# Altium schematic symbol library jlcpcb_2025_04_ferrites_extended_0603.schlib: 833 symbols (part 2 of 4)
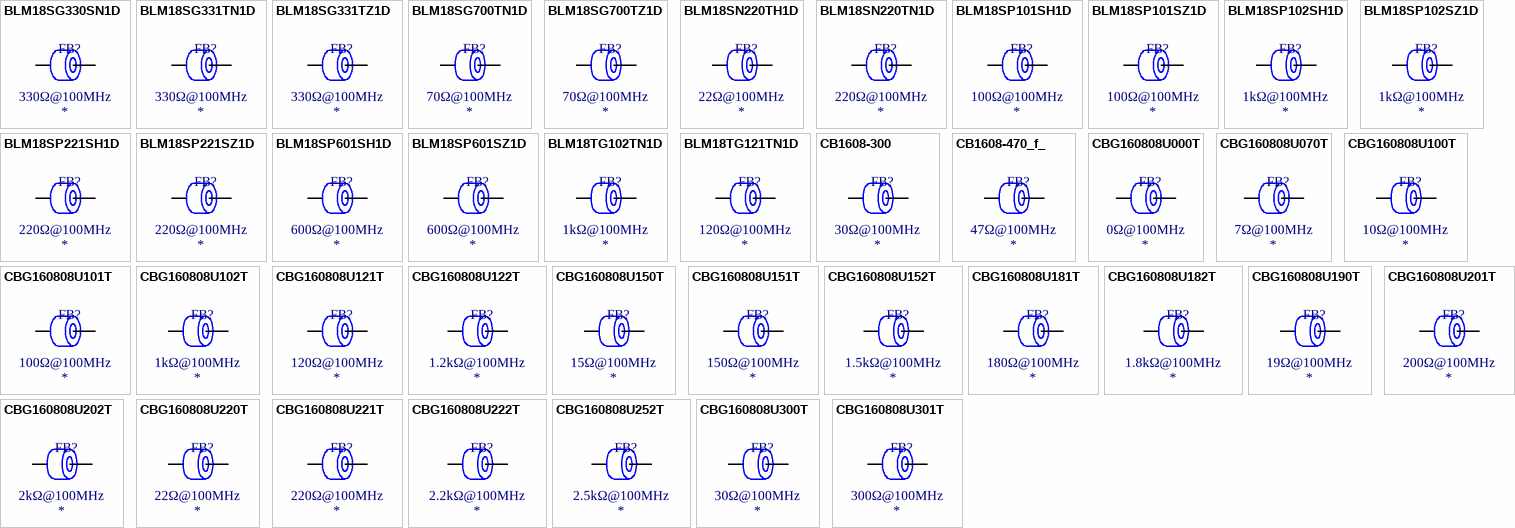
[diagram p21: symbols BLM18SG330SN1D to CBG160808U301T]

## BLM18SN220TH1D
designator FB?  Impedance @ Frequency: 22Ω@100MHz
Ferrite, 22Ω@100MHz, ±7%, 4mΩ, 8A, SMD 0603; Manufacturer: Murata Electronics; Manufacturer Part Number: BLM18SN220TH1D; Package Size: 0603; JLCPCB Basic Part: No; JLCPCB Part Number: C710392; Supplier 1: LCSC; Category: Ferrite Beads; Supplier Part Number 1: C710392; Tolerance: ±7%; Rated Current: 8A; DC Resistance: 4mΩ; RoHS: Yes; ComponentLink1Description: Datasheet; ComponentLink1URL: https://wmsc.lcsc.com/wmsc/upload/file/pdf/v2/lcsc/2304140030_Murata-Electronics-BLM18SN220TH1D_C710392.pdf; ComponentLink2Description: JLCPCB Part URL; ComponentLink2URL: https://jlcpcb.com/partdetail/C710392; ComponentLink3Description: LCSC Part URL; ComponentLink3URL: https://lcsc.com/product-detail/Ferrite-Beads_Murata-Electronics-Murata-Electronics-BLM18SN220TH1D_C710392.html
footprint FB-0603 (0603 (1608M) Ferrite)
pins: 1, 2

## BLM18SN220TN1D
designator FB?  Impedance @ Frequency: 220Ω@100MHz
Ferrite, 220Ω@100MHz, ±7%, 4mΩ, 8A, SMD 0603; Manufacturer: Murata Electronics; Manufacturer Part Number: BLM18SN220TN1D; Package Size: 0603; JLCPCB Basic Part: No; JLCPCB Part Number: C560057; Supplier 1: LCSC; Category: Ferrite Beads; Supplier Part Number 1: C560057; Tolerance: ±7%; Rated Current: 8A; DC Resistance: 4mΩ; RoHS: Yes; ComponentLink1Description: Datasheet; ComponentLink1URL: https://wmsc.lcsc.com/wmsc/upload/file/pdf/v2/lcsc/2009151403_Murata-Electronics-BLM18SN220TN1D_C560057.pdf; ComponentLink2Description: JLCPCB Part URL; ComponentLink2URL: https://jlcpcb.com/partdetail/C560057; ComponentLink3Description: LCSC Part URL; ComponentLink3URL: https://lcsc.com/product-detail/Ferrite-Beads_Murata-Electronics-Murata-Electronics-BLM18SN220TN1D_C560057.html
footprint FB-0603 (0603 (1608M) Ferrite)
pins: 1, 2

## BLM18SP101SH1D
designator FB?  Impedance @ Frequency: 100Ω@100MHz
Ferrite, 100Ω@100MHz, ±25%, 22mΩ, 3.7A, SMD 0603; Manufacturer: Murata Electronics; Manufacturer Part Number: BLM18SP101SH1D; Package Size: 0603; JLCPCB Basic Part: No; JLCPCB Part Number: C1512135; Supplier 1: LCSC; Category: Ferrite Beads; Supplier Part Number 1: C1512135; Tolerance: ±25%; Rated Current: 3.7A; DC Resistance: 22mΩ; RoHS: Yes; ComponentLink1Description: Datasheet; ComponentLink1URL: https://wmsc.lcsc.com/wmsc/upload/file/pdf/v2/lcsc/2304140030_Murata-Electronics-BLM18SP101SH1D_C1512135.pdf; ComponentLink2Description: JLCPCB Part URL; ComponentLink2URL: https://jlcpcb.com/partdetail/C1512135; ComponentLink3Description: LCSC Part URL; ComponentLink3URL: https://lcsc.com/product-detail/Ferrite-Beads_Murata-Electronics-Murata-Electronics-BLM18SP101SH1D_C1512135.html
footprint FB-0603 (0603 (1608M) Ferrite)
pins: 1, 2

## BLM18SP101SZ1D
designator FB?  Impedance @ Frequency: 100Ω@100MHz
Ferrite, 100Ω@100MHz, ±25%, 22mΩ, 3.7A, SMD 0603; Manufacturer: Murata Electronics; Manufacturer Part Number: BLM18SP101SZ1D; Package Size: 0603; JLCPCB Basic Part: No; JLCPCB Part Number: C1512136; Supplier 1: LCSC; Category: Ferrite Beads; Supplier Part Number 1: C1512136; Tolerance: ±25%; Rated Current: 3.7A; DC Resistance: 22mΩ; RoHS: Yes; ComponentLink1Description: Datasheet; ComponentLink1URL: https://wmsc.lcsc.com/wmsc/upload/file/pdf/v2/lcsc/2304140030_Murata-Electronics-BLM18SP101SZ1D_C1512136.pdf; ComponentLink2Description: JLCPCB Part URL; ComponentLink2URL: https://jlcpcb.com/partdetail/C1512136; ComponentLink3Description: LCSC Part URL; ComponentLink3URL: https://lcsc.com/product-detail/Ferrite-Beads_Murata-Electronics-Murata-Electronics-BLM18SP101SZ1D_C1512136.html
footprint FB-0603 (0603 (1608M) Ferrite)
pins: 1, 2

## BLM18SP102SH1D
designator FB?  Impedance @ Frequency: 1kΩ@100MHz
Ferrite, 1kΩ@100MHz, ±25%, 185mΩ, 1.2A, SMD 0603; Manufacturer: Murata Electronics; Manufacturer Part Number: BLM18SP102SH1D; Package Size: 0603; JLCPCB Basic Part: No; JLCPCB Part Number: C1512132; Supplier 1: LCSC; Category: Ferrite Beads; Supplier Part Number 1: C1512132; Tolerance: ±25%; Rated Current: 1.2A; DC Resistance: 185mΩ; RoHS: Yes; ComponentLink1Description: Datasheet; ComponentLink1URL: https://wmsc.lcsc.com/wmsc/upload/file/pdf/v2/lcsc/2304140030_Murata-Electronics-BLM18SP102SH1D_C1512132.pdf; ComponentLink2Description: JLCPCB Part URL; ComponentLink2URL: https://jlcpcb.com/partdetail/C1512132; ComponentLink3Description: LCSC Part URL; ComponentLink3URL: https://lcsc.com/product-detail/Ferrite-Beads_Murata-Electronics-Murata-Electronics-BLM18SP102SH1D_C1512132.html
footprint FB-0603 (0603 (1608M) Ferrite)
pins: 1, 2

## BLM18SP102SZ1D
designator FB?  Impedance @ Frequency: 1kΩ@100MHz
Ferrite, 1kΩ@100MHz, ±25%, 185mΩ, 1.2A, SMD 0603; Manufacturer: Murata Electronics; Manufacturer Part Number: BLM18SP102SZ1D; Package Size: 0603; JLCPCB Basic Part: No; JLCPCB Part Number: C1019083; Supplier 1: LCSC; Category: Ferrite Beads; Supplier Part Number 1: C1019083; Tolerance: ±25%; Rated Current: 1.2A; DC Resistance: 185mΩ; RoHS: Yes; ComponentLink1Description: Datasheet; ComponentLink1URL: https://wmsc.lcsc.com/wmsc/upload/file/pdf/v2/lcsc/2304140030_Murata-Electronics-BLM18SP102SZ1D_C1019083.pdf; ComponentLink2Description: JLCPCB Part URL; ComponentLink2URL: https://jlcpcb.com/partdetail/C1019083; ComponentLink3Description: LCSC Part URL; ComponentLink3URL: https://lcsc.com/product-detail/Ferrite-Beads_Murata-Electronics-Murata-Electronics-BLM18SP102SZ1D_C1019083.html
footprint FB-0603 (0603 (1608M) Ferrite)
pins: 1, 2

## BLM18SP221SH1D
designator FB?  Impedance @ Frequency: 220Ω@100MHz
Ferrite, 220Ω@100MHz, ±25%, 40mΩ, 2.8A, SMD 0603; Manufacturer: Murata Electronics; Manufacturer Part Number: BLM18SP221SH1D; Package Size: 0603; JLCPCB Basic Part: No; JLCPCB Part Number: C1512134; Supplier 1: LCSC; Category: Ferrite Beads; Supplier Part Number 1: C1512134; Tolerance: ±25%; Rated Current: 2.8A; DC Resistance: 40mΩ; RoHS: Yes; ComponentLink1Description: Datasheet; ComponentLink1URL: https://wmsc.lcsc.com/wmsc/upload/file/pdf/v2/lcsc/2304140030_Murata-Electronics-BLM18SP221SH1D_C1512134.pdf; ComponentLink2Description: JLCPCB Part URL; ComponentLink2URL: https://jlcpcb.com/partdetail/C1512134; ComponentLink3Description: LCSC Part URL; ComponentLink3URL: https://lcsc.com/product-detail/Ferrite-Beads_Murata-Electronics-Murata-Electronics-BLM18SP221SH1D_C1512134.html
footprint FB-0603 (0603 (1608M) Ferrite)
pins: 1, 2

## BLM18SP221SZ1D
designator FB?  Impedance @ Frequency: 220Ω@100MHz
Ferrite, 220Ω@100MHz, 40mΩ, SMD 0603; Manufacturer: Murata Electronics; Manufacturer Part Number: BLM18SP221SZ1D; Package Size: 0603; JLCPCB Basic Part: No; JLCPCB Part Number: C3764469; Supplier 1: LCSC; Category: Ferrite Beads; Supplier Part Number 1: C3764469; DC Resistance: 40mΩ; RoHS: Yes; ComponentLink1Description: Datasheet; ComponentLink1URL: https://wmsc.lcsc.com/wmsc/upload/file/pdf/v2/lcsc/2308111558_Murata-Electronics-BLM18SP221SZ1D_C3764469.pdf; ComponentLink2Description: JLCPCB Part URL; ComponentLink2URL: https://jlcpcb.com/partdetail/C3764469; ComponentLink3Description: LCSC Part URL; ComponentLink3URL: https://lcsc.com/product-detail/Ferrite-Beads_Murata-Electronics-Murata-Electronics-BLM18SP221SZ1D_C3764469.html
pins: 1, 2

## BLM18SP601SH1D
designator FB?  Impedance @ Frequency: 600Ω@100MHz
Ferrite, 600Ω@100MHz, ±25%, 140mΩ, 1.5A, SMD 0603; Manufacturer: Murata Electronics; Manufacturer Part Number: BLM18SP601SH1D; Package Size: 0603; JLCPCB Basic Part: No; JLCPCB Part Number: C1512133; Supplier 1: LCSC; Category: Ferrite Beads; Supplier Part Number 1: C1512133; Tolerance: ±25%; Rated Current: 1.5A; DC Resistance: 140mΩ; RoHS: Yes; ComponentLink1Description: Datasheet; ComponentLink1URL: https://wmsc.lcsc.com/wmsc/upload/file/pdf/v2/lcsc/2304140030_Murata-Electronics-BLM18SP601SH1D_C1512133.pdf; ComponentLink2Description: JLCPCB Part URL; ComponentLink2URL: https://jlcpcb.com/partdetail/C1512133; ComponentLink3Description: LCSC Part URL; ComponentLink3URL: https://lcsc.com/product-detail/Ferrite-Beads_Murata-Electronics-Murata-Electronics-BLM18SP601SH1D_C1512133.html
footprint FB-0603 (0603 (1608M) Ferrite)
pins: 1, 2

## BLM18SP601SZ1D
designator FB?  Impedance @ Frequency: 600Ω@100MHz
Ferrite, 600Ω@100MHz, ±25%, 140mΩ, 1.5A, SMD 0603; Manufacturer: Murata Electronics; Manufacturer Part Number: BLM18SP601SZ1D; Package Size: 0603; JLCPCB Basic Part: No; JLCPCB Part Number: C1019082; Supplier 1: LCSC; Category: Ferrite Beads; Supplier Part Number 1: C1019082; Tolerance: ±25%; Rated Current: 1.5A; DC Resistance: 140mΩ; RoHS: Yes; ComponentLink1Description: Datasheet; ComponentLink1URL: https://wmsc.lcsc.com/wmsc/upload/file/pdf/v2/lcsc/2304140030_Murata-Electronics-BLM18SP601SZ1D_C1019082.pdf; ComponentLink2Description: JLCPCB Part URL; ComponentLink2URL: https://jlcpcb.com/partdetail/C1019082; ComponentLink3Description: LCSC Part URL; ComponentLink3URL: https://lcsc.com/product-detail/Ferrite-Beads_Murata-Electronics-Murata-Electronics-BLM18SP601SZ1D_C1019082.html
footprint FB-0603 (0603 (1608M) Ferrite)
pins: 1, 2

## BLM18TG102TN1D
designator FB?  Impedance @ Frequency: 1kΩ@100MHz
Ferrite, 1kΩ@100MHz, ±25%, 600mΩ, 100mA, SMD 0603; Manufacturer: Murata Electronics; Manufacturer Part Number: BLM18TG102TN1D; Package Size: 0603; JLCPCB Basic Part: No; JLCPCB Part Number: C113032; Supplier 1: LCSC; Category: Ferrite Beads; Supplier Part Number 1: C113032; Tolerance: ±25%; Rated Current: 100mA; DC Resistance: 600mΩ; RoHS: Yes; ComponentLink1Description: Datasheet; ComponentLink1URL: https://wmsc.lcsc.com/wmsc/upload/file/pdf/v2/lcsc/2304140030_Murata-Electronics-BLM18TG102TN1D_C113032.pdf; ComponentLink2Description: JLCPCB Part URL; ComponentLink2URL: https://jlcpcb.com/partdetail/C113032; ComponentLink3Description: LCSC Part URL; ComponentLink3URL: https://lcsc.com/product-detail/Ferrite-Beads_Murata-Electronics-Murata-Electronics-BLM18TG102TN1D_C113032.html
footprint FB-0603 (0603 (1608M) Ferrite)
pins: 1, 2

## BLM18TG121TN1D
designator FB?  Impedance @ Frequency: 120Ω@100MHz
Ferrite, 120Ω@100MHz, ±25%, 250mΩ, 200mA, SMD 0603; Manufacturer: Murata Electronics; Manufacturer Part Number: BLM18TG121TN1D; Package Size: 0603; JLCPCB Basic Part: No; JLCPCB Part Number: C710394; Supplier 1: LCSC; Category: Ferrite Beads; Supplier Part Number 1: C710394; Tolerance: ±25%; Rated Current: 200mA; DC Resistance: 250mΩ; RoHS: Yes; ComponentLink1Description: Datasheet; ComponentLink1URL: https://wmsc.lcsc.com/wmsc/upload/file/pdf/v2/lcsc/2201131100_Murata-Electronics-BLM18TG121TN1D_C710394.pdf; ComponentLink2Description: JLCPCB Part URL; ComponentLink2URL: https://jlcpcb.com/partdetail/C710394; ComponentLink3Description: LCSC Part URL; ComponentLink3URL: https://lcsc.com/product-detail/Ferrite-Beads_Murata-Electronics-Murata-Electronics-BLM18TG121TN1D_C710394.html
footprint FB-0603 (0603 (1608M) Ferrite)
pins: 1, 2

## CB1608-300
designator FB?  Impedance @ Frequency: 30Ω@100MHz
Ferrite, 30Ω@100MHz, ±25%, SMD 0603; Manufacturer: CEC(Shenzhen Zhenhua Fu Elec); Manufacturer Part Number: CB1608-300; Package Size: 0603; JLCPCB Basic Part: No; JLCPCB Part Number: C316263; Supplier 1: LCSC; Category: Ferrite Beads; Supplier Part Number 1: C316263; Tolerance: ±25%; RoHS: Yes; ComponentLink1Description: Datasheet; ComponentLink1URL: https://wmsc.lcsc.com/wmsc/upload/file/pdf/v2/lcsc/2304140030_CEC-Shenzhen-Zhenhua-Fu-Elec-CB1608-300_C316263.pdf; ComponentLink2Description: JLCPCB Part URL; ComponentLink2URL: https://jlcpcb.com/partdetail/C316263; ComponentLink3Description: LCSC Part URL; ComponentLink3URL: https://lcsc.com/product-detail/Ferrite-Beads_CECShenzhen-Zhenhua-Fu-Elec-CECShenzhen-Zhenhua-Fu-Elec-CB1608-300_C316263.html
pins: 1, 2

## CB1608-470_f_
designator FB?  Impedance @ Frequency: 47Ω@100MHz
Ferrite, 47Ω@100MHz, ±25%, SMD 0603; Manufacturer: CEC(Shenzhen Zhenhua Fu Elec); Manufacturer Part Number: CB1608-470(f); Package Size: 0603; JLCPCB Basic Part: No; JLCPCB Part Number: C361682; Supplier 1: LCSC; Category: Ferrite Beads; Supplier Part Number 1: C361682; Tolerance: ±25%; RoHS: Yes; ComponentLink1Description: Datasheet; ComponentLink1URL: https://wmsc.lcsc.com/wmsc/upload/file/pdf/v2/lcsc/2304140030_CEC-Shenzhen-Zhenhua-Fu-Elec-CB1608-470-f_C361682.pdf; ComponentLink2Description: JLCPCB Part URL; ComponentLink2URL: https://jlcpcb.com/partdetail/C361682; ComponentLink3Description: LCSC Part URL; ComponentLink3URL: https://lcsc.com/product-detail/Ferrite-Beads_CECShenzhen-Zhenhua-Fu-Elec-CECShenzhen-Zhenhua-Fu-Elec-CB1608-470f_C361682.html
pins: 1, 2

## CBG160808U000T
designator FB?  Impedance @ Frequency: 0Ω@100MHz
Ferrite, 0Ω@100MHz, 100mΩ, 800mA, SMD 0603; Manufacturer: FH(Guangdong Fenghua Advanced Tech); Manufacturer Part Number: CBG160808U000T; Package Size: 0603; JLCPCB Basic Part: No; JLCPCB Part Number: C43163; Supplier 1: LCSC; Category: Ferrite Beads; Supplier Part Number 1: C43163; Rated Current: 800mA; DC Resistance: 100mΩ; RoHS: Yes; ComponentLink1Description: Datasheet; ComponentLink1URL: https://wmsc.lcsc.com/wmsc/upload/file/pdf/v2/lcsc/2304140030_FH--Guangdong-Fenghua-Advanced-Tech-CBG160808U000T_C43163.pdf; ComponentLink2Description: JLCPCB Part URL; ComponentLink2URL: https://jlcpcb.com/partdetail/C43163; ComponentLink3Description: LCSC Part URL; ComponentLink3URL: https://lcsc.com/product-detail/Ferrite-Beads_FH-Guangdong-Fenghua-Advanced-Tech-FH-Guangdong-Fenghua-Advanced-Tech-CBG160808U000T_C43163.html
pins: 1, 2

## CBG160808U070T
designator FB?  Impedance @ Frequency: 7Ω@100MHz
Ferrite, 7Ω@100MHz, 100mΩ, 800mA, SMD 0603; Manufacturer: FH(Guangdong Fenghua Advanced Tech); Manufacturer Part Number: CBG160808U070T; Package Size: 0603; JLCPCB Basic Part: No; JLCPCB Part Number: C98494; Supplier 1: LCSC; Category: Ferrite Beads; Supplier Part Number 1: C98494; Rated Current: 800mA; DC Resistance: 100mΩ; RoHS: Yes; ComponentLink1Description: Datasheet; ComponentLink1URL: https://wmsc.lcsc.com/wmsc/upload/file/pdf/v2/lcsc/2304140030_FH--Guangdong-Fenghua-Advanced-Tech-CBG160808U070T_C98494.pdf; ComponentLink2Description: JLCPCB Part URL; ComponentLink2URL: https://jlcpcb.com/partdetail/C98494; ComponentLink3Description: LCSC Part URL; ComponentLink3URL: https://lcsc.com/product-detail/Ferrite-Beads_FH-Guangdong-Fenghua-Advanced-Tech-FH-Guangdong-Fenghua-Advanced-Tech-CBG160808U070T_C98494.html
pins: 1, 2

## CBG160808U100T
designator FB?  Impedance @ Frequency: 10Ω@100MHz
Ferrite, 10Ω@100MHz, ±25%, SMD 0603; Manufacturer: FH(Guangdong Fenghua Advanced Tech); Manufacturer Part Number: CBG160808U100T; Package Size: 0603; JLCPCB Basic Part: No; JLCPCB Part Number: C139139; Supplier 1: LCSC; Category: Ferrite Beads; Supplier Part Number 1: C139139; Tolerance: ±25%; RoHS: Yes; ComponentLink1Description: Datasheet; ComponentLink1URL: https://wmsc.lcsc.com/wmsc/upload/file/pdf/v2/lcsc/2304140030_FH--Guangdong-Fenghua-Advanced-Tech-CBG160808U100T_C139139.pdf; ComponentLink2Description: JLCPCB Part URL; ComponentLink2URL: https://jlcpcb.com/partdetail/C139139; ComponentLink3Description: LCSC Part URL; ComponentLink3URL: https://lcsc.com/product-detail/Ferrite-Beads_FH-Guangdong-Fenghua-Advanced-Tech-FH-Guangdong-Fenghua-Advanced-Tech-CBG160808U100T_C139139.html
pins: 1, 2

## CBG160808U101T
designator FB?  Impedance @ Frequency: 100Ω@100MHz
Ferrite, 100Ω@100MHz, ±25%, 300mΩ, 200mA, SMD 0603; Manufacturer: FH(Guangdong Fenghua Advanced Tech); Manufacturer Part Number: CBG160808U101T; Package Size: 0603; JLCPCB Basic Part: No; JLCPCB Part Number: C98498; Supplier 1: LCSC; Category: Ferrite Beads; Supplier Part Number 1: C98498; Tolerance: ±25%; Rated Current: 200mA; DC Resistance: 300mΩ; RoHS: Yes; ComponentLink1Description: Datasheet; ComponentLink1URL: https://wmsc.lcsc.com/wmsc/upload/file/pdf/v2/lcsc/2304140030_FH--Guangdong-Fenghua-Advanced-Tech-CBG160808U101T_C98498.pdf; ComponentLink2Description: JLCPCB Part URL; ComponentLink2URL: https://jlcpcb.com/partdetail/C98498; ComponentLink3Description: LCSC Part URL; ComponentLink3URL: https://lcsc.com/product-detail/Ferrite-Beads_FH-Guangdong-Fenghua-Advanced-Tech-FH-Guangdong-Fenghua-Advanced-Tech-CBG160808U101T_C98498.html
footprint FB-0603 (0603 (1608M) Ferrite)
pins: 1, 2

## CBG160808U102T
designator FB?  Impedance @ Frequency: 1kΩ@100MHz
Ferrite, 1kΩ@100MHz, ±25%, 600mΩ, 200mA, SMD 0603; Manufacturer: FH(Guangdong Fenghua Advanced Tech); Manufacturer Part Number: CBG160808U102T; Package Size: 0603; JLCPCB Basic Part: No; JLCPCB Part Number: C98501; Supplier 1: LCSC; Category: Ferrite Beads; Supplier Part Number 1: C98501; Tolerance: ±25%; Rated Current: 200mA; DC Resistance: 600mΩ; RoHS: Yes; ComponentLink1Description: Datasheet; ComponentLink1URL: https://wmsc.lcsc.com/wmsc/upload/file/pdf/v2/lcsc/2304140030_FH--Guangdong-Fenghua-Advanced-Tech-CBG160808U102T_C98501.pdf; ComponentLink2Description: JLCPCB Part URL; ComponentLink2URL: https://jlcpcb.com/partdetail/C98501; ComponentLink3Description: LCSC Part URL; ComponentLink3URL: https://lcsc.com/product-detail/Ferrite-Beads_FH-Guangdong-Fenghua-Advanced-Tech-FH-Guangdong-Fenghua-Advanced-Tech-CBG160808U102T_C98501.html
footprint FB-0603 (0603 (1608M) Ferrite)
pins: 1, 2

## CBG160808U121T
designator FB?  Impedance @ Frequency: 120Ω@100MHz
Ferrite, 120Ω@100MHz, ±25%, 300mΩ, 200mA, SMD 0603; Manufacturer: FH(Guangdong Fenghua Advanced Tech); Manufacturer Part Number: CBG160808U121T; Package Size: 0603; JLCPCB Basic Part: No; JLCPCB Part Number: C50843; Supplier 1: LCSC; Category: Ferrite Beads; Supplier Part Number 1: C50843; Tolerance: ±25%; Rated Current: 200mA; DC Resistance: 300mΩ; RoHS: Yes; ComponentLink1Description: Datasheet; ComponentLink1URL: https://wmsc.lcsc.com/wmsc/upload/file/pdf/v2/lcsc/2304140030_FH--Guangdong-Fenghua-Advanced-Tech-CBG160808U121T_C50843.pdf; ComponentLink2Description: JLCPCB Part URL; ComponentLink2URL: https://jlcpcb.com/partdetail/C50843; ComponentLink3Description: LCSC Part URL; ComponentLink3URL: https://lcsc.com/product-detail/Ferrite-Beads_FH-Guangdong-Fenghua-Advanced-Tech-FH-Guangdong-Fenghua-Advanced-Tech-CBG160808U121T_C50843.html
footprint FB-0603 (0603 (1608M) Ferrite)
pins: 1, 2

## CBG160808U122T
designator FB?  Impedance @ Frequency: 1.2kΩ@100MHz
Ferrite, 1.2kΩ@100MHz, ±25%, 850mΩ, 100mA, SMD 0603; Manufacturer: FH(Guangdong Fenghua Advanced Tech); Manufacturer Part Number: CBG160808U122T; Package Size: 0603; JLCPCB Basic Part: No; JLCPCB Part Number: C98502; Supplier 1: LCSC; Category: Ferrite Beads; Supplier Part Number 1: C98502; Tolerance: ±25%; Rated Current: 100mA; DC Resistance: 850mΩ; RoHS: Yes; ComponentLink1Description: Datasheet; ComponentLink1URL: https://wmsc.lcsc.com/wmsc/upload/file/pdf/v2/lcsc/2304140030_FH--Guangdong-Fenghua-Advanced-Tech-CBG160808U122T_C98502.pdf; ComponentLink2Description: JLCPCB Part URL; ComponentLink2URL: https://jlcpcb.com/partdetail/C98502; ComponentLink3Description: LCSC Part URL; ComponentLink3URL: https://lcsc.com/product-detail/Ferrite-Beads_FH-Guangdong-Fenghua-Advanced-Tech-FH-Guangdong-Fenghua-Advanced-Tech-CBG160808U122T_C98502.html
footprint FB-0603 (0603 (1608M) Ferrite)
pins: 1, 2

## CBG160808U150T
designator FB?  Impedance @ Frequency: 15Ω@100MHz
Ferrite, 15Ω@100MHz, 100mΩ, 800mA, SMD 0603; Manufacturer: FH(Guangdong Fenghua Advanced Tech); Manufacturer Part Number: CBG160808U150T; Package Size: 0603; JLCPCB Basic Part: No; JLCPCB Part Number: C98495; Supplier 1: LCSC; Category: Ferrite Beads; Supplier Part Number 1: C98495; Rated Current: 800mA; DC Resistance: 100mΩ; RoHS: Yes; ComponentLink1Description: Datasheet; ComponentLink1URL: https://wmsc.lcsc.com/wmsc/upload/file/pdf/v2/lcsc/2304140030_FH--Guangdong-Fenghua-Advanced-Tech-CBG160808U150T_C98495.pdf; ComponentLink2Description: JLCPCB Part URL; ComponentLink2URL: https://jlcpcb.com/partdetail/C98495; ComponentLink3Description: LCSC Part URL; ComponentLink3URL: https://lcsc.com/product-detail/Ferrite-Beads_FH-Guangdong-Fenghua-Advanced-Tech-FH-Guangdong-Fenghua-Advanced-Tech-CBG160808U150T_C98495.html
pins: 1, 2

## CBG160808U151T
designator FB?  Impedance @ Frequency: 150Ω@100MHz
Ferrite, 150Ω@100MHz, ±25%, 300mΩ, 300mA, SMD 0603; Manufacturer: FH(Guangdong Fenghua Advanced Tech); Manufacturer Part Number: CBG160808U151T; Package Size: 0603; JLCPCB Basic Part: No; JLCPCB Part Number: C98488; Supplier 1: LCSC; Category: Ferrite Beads; Supplier Part Number 1: C98488; Tolerance: ±25%; Rated Current: 300mA; DC Resistance: 300mΩ; RoHS: Yes; ComponentLink1Description: Datasheet; ComponentLink1URL: https://wmsc.lcsc.com/wmsc/upload/file/pdf/v2/lcsc/2304140030_FH--Guangdong-Fenghua-Advanced-Tech-CBG160808U151T_C98488.pdf; ComponentLink2Description: JLCPCB Part URL; ComponentLink2URL: https://jlcpcb.com/partdetail/C98488; ComponentLink3Description: LCSC Part URL; ComponentLink3URL: https://lcsc.com/product-detail/Ferrite-Beads_FH-Guangdong-Fenghua-Advanced-Tech-FH-Guangdong-Fenghua-Advanced-Tech-CBG160808U151T_C98488.html
footprint FB-0603 (0603 (1608M) Ferrite)
pins: 1, 2

## CBG160808U152T
designator FB?  Impedance @ Frequency: 1.5kΩ@100MHz
Ferrite, 1.5kΩ@100MHz, ±25%, 850mΩ, 50mA, SMD 0603; Manufacturer: FH(Guangdong Fenghua Advanced Tech); Manufacturer Part Number: CBG160808U152T; Package Size: 0603; JLCPCB Basic Part: No; JLCPCB Part Number: C98503; Supplier 1: LCSC; Category: Ferrite Beads; Supplier Part Number 1: C98503; Tolerance: ±25%; Rated Current: 50mA; DC Resistance: 850mΩ; RoHS: Yes; ComponentLink1Description: Datasheet; ComponentLink1URL: https://wmsc.lcsc.com/wmsc/upload/file/pdf/v2/lcsc/2304140030_FH--Guangdong-Fenghua-Advanced-Tech-CBG160808U152T_C98503.pdf; ComponentLink2Description: JLCPCB Part URL; ComponentLink2URL: https://jlcpcb.com/partdetail/C98503; ComponentLink3Description: LCSC Part URL; ComponentLink3URL: https://lcsc.com/product-detail/Ferrite-Beads_FH-Guangdong-Fenghua-Advanced-Tech-FH-Guangdong-Fenghua-Advanced-Tech-CBG160808U152T_C98503.html
footprint FB-0603 (0603 (1608M) Ferrite)
pins: 1, 2

## CBG160808U181T
designator FB?  Impedance @ Frequency: 180Ω@100MHz
Ferrite, 180Ω@100MHz, ±25%, 300mΩ, 300mA, SMD 0603; Manufacturer: FH(Guangdong Fenghua Advanced Tech); Manufacturer Part Number: CBG160808U181T; Package Size: 0603; JLCPCB Basic Part: No; JLCPCB Part Number: C98489; Supplier 1: LCSC; Category: Ferrite Beads; Supplier Part Number 1: C98489; Tolerance: ±25%; Rated Current: 300mA; DC Resistance: 300mΩ; RoHS: Yes; ComponentLink1Description: Datasheet; ComponentLink1URL: https://wmsc.lcsc.com/wmsc/upload/file/pdf/v2/lcsc/2304140030_FH--Guangdong-Fenghua-Advanced-Tech-CBG160808U181T_C98489.pdf; ComponentLink2Description: JLCPCB Part URL; ComponentLink2URL: https://jlcpcb.com/partdetail/C98489; ComponentLink3Description: LCSC Part URL; ComponentLink3URL: https://lcsc.com/product-detail/Ferrite-Beads_FH-Guangdong-Fenghua-Advanced-Tech-FH-Guangdong-Fenghua-Advanced-Tech-CBG160808U181T_C98489.html
footprint FB-0603 (0603 (1608M) Ferrite)
pins: 1, 2

## CBG160808U182T
designator FB?  Impedance @ Frequency: 1.8kΩ@100MHz
Ferrite, 1.8kΩ@100MHz, ±25%, 1.1Ω, 50mA, SMD 0603; Manufacturer: FH(Guangdong Fenghua Advanced Tech); Manufacturer Part Number: CBG160808U182T; Package Size: 0603; JLCPCB Basic Part: No; JLCPCB Part Number: C98504; Supplier 1: LCSC; Category: Ferrite Beads; Supplier Part Number 1: C98504; Tolerance: ±25%; Rated Current: 50mA; DC Resistance: 1.1Ω; RoHS: Yes; ComponentLink1Description: Datasheet; ComponentLink1URL: https://wmsc.lcsc.com/wmsc/upload/file/pdf/v2/lcsc/2304140030_FH--Guangdong-Fenghua-Advanced-Tech-CBG160808U182T_C98504.pdf; ComponentLink2Description: JLCPCB Part URL; ComponentLink2URL: https://jlcpcb.com/partdetail/C98504; ComponentLink3Description: LCSC Part URL; ComponentLink3URL: https://lcsc.com/product-detail/Ferrite-Beads_FH-Guangdong-Fenghua-Advanced-Tech-FH-Guangdong-Fenghua-Advanced-Tech-CBG160808U182T_C98504.html
footprint FB-0603 (0603 (1608M) Ferrite)
pins: 1, 2

## CBG160808U190T
designator FB?  Impedance @ Frequency: 19Ω@100MHz
Ferrite, 19Ω@100MHz, 100mΩ, 800mA, SMD 0603; Manufacturer: FH(Guangdong Fenghua Advanced Tech); Manufacturer Part Number: CBG160808U190T; Package Size: 0603; JLCPCB Basic Part: No; JLCPCB Part Number: C98496; Supplier 1: LCSC; Category: Ferrite Beads; Supplier Part Number 1: C98496; Rated Current: 800mA; DC Resistance: 100mΩ; RoHS: Yes; ComponentLink1Description: Datasheet; ComponentLink1URL: https://wmsc.lcsc.com/wmsc/upload/file/pdf/v2/lcsc/2304140030_FH--Guangdong-Fenghua-Advanced-Tech-CBG160808U190T_C98496.pdf; ComponentLink2Description: JLCPCB Part URL; ComponentLink2URL: https://jlcpcb.com/partdetail/C98496; ComponentLink3Description: LCSC Part URL; ComponentLink3URL: https://lcsc.com/product-detail/Ferrite-Beads_FH-Guangdong-Fenghua-Advanced-Tech-FH-Guangdong-Fenghua-Advanced-Tech-CBG160808U190T_C98496.html
pins: 1, 2

## CBG160808U201T
designator FB?  Impedance @ Frequency: 200Ω@100MHz
Ferrite, 200Ω@100MHz, SMD 0603; Manufacturer: FH(Guangdong Fenghua Advanced Tech); Manufacturer Part Number: CBG160808U201T; Package Size: 0603; JLCPCB Basic Part: No; JLCPCB Part Number: C401502; Supplier 1: LCSC; Category: Ferrite Beads; Supplier Part Number 1: C401502; RoHS: Yes; ComponentLink1Description: Datasheet; ComponentLink2Description: JLCPCB Part URL; ComponentLink2URL: https://jlcpcb.com/partdetail/C401502; ComponentLink3Description: LCSC Part URL; ComponentLink3URL: https://lcsc.com/product-detail/Ferrite-Beads_FH-Guangdong-Fenghua-Advanced-Tech-FH-Guangdong-Fenghua-Advanced-Tech-CBG160808U201T_C401502.html
pins: 1, 2

## CBG160808U202T
designator FB?  Impedance @ Frequency: 2kΩ@100MHz
Ferrite, 2kΩ@100MHz, ±25%, 1.1Ω, 50mA, SMD 0603; Manufacturer: FH(Guangdong Fenghua Advanced Tech); Manufacturer Part Number: CBG160808U202T; Package Size: 0603; JLCPCB Basic Part: No; JLCPCB Part Number: C20118; Supplier 1: LCSC; Category: Ferrite Beads; Supplier Part Number 1: C20118; Tolerance: ±25%; Rated Current: 50mA; DC Resistance: 1.1Ω; RoHS: Yes; ComponentLink1Description: Datasheet; ComponentLink1URL: https://wmsc.lcsc.com/wmsc/upload/file/pdf/v2/lcsc/1811061811_FH--Guangdong-Fenghua-Advanced-Tech-CBG160808U202T_C20118.pdf; ComponentLink2Description: JLCPCB Part URL; ComponentLink2URL: https://jlcpcb.com/partdetail/C20118; ComponentLink3Description: LCSC Part URL; ComponentLink3URL: https://lcsc.com/product-detail/Ferrite-Beads_FH-Guangdong-Fenghua-Advanced-Tech-FH-Guangdong-Fenghua-Advanced-Tech-CBG160808U202T_C20118.html
footprint FB-0603 (0603 (1608M) Ferrite)
pins: 1, 2

## CBG160808U220T
designator FB?  Impedance @ Frequency: 22Ω@100MHz
Ferrite, 22Ω@100MHz, SMD 0603; Manufacturer: FH (Guangdong Fenghua Advanced Tech); Manufacturer Part Number: CBG160808U220T; Package Size: 0603; JLCPCB Basic Part: No; JLCPCB Part Number: C401501; Supplier 1: LCSC; Category: Ferrite Beads; Supplier Part Number 1: C401501; RoHS: Yes; ComponentLink1Description: Datasheet; ComponentLink2Description: JLCPCB Part URL; ComponentLink2URL: https://jlcpcb.com/partdetail/C401501; ComponentLink3Description: LCSC Part URL; ComponentLink3URL: https://lcsc.com/product-detail/Ferrite-Beads_FH-Guangdong-Fenghua-Advanced-Tech-FH-Guangdong-Fenghua-Advanced-Tech-CBG160808U220T_C401501.html
pins: 1, 2

## CBG160808U221T
designator FB?  Impedance @ Frequency: 220Ω@100MHz
Ferrite, 220Ω@100MHz, ±25%, 300mΩ, 300mA, SMD 0603; Manufacturer: FH(Guangdong Fenghua Advanced Tech); Manufacturer Part Number: CBG160808U221T; Package Size: 0603; JLCPCB Basic Part: No; JLCPCB Part Number: C92619; Supplier 1: LCSC; Category: Ferrite Beads; Supplier Part Number 1: C92619; Tolerance: ±25%; Rated Current: 300mA; DC Resistance: 300mΩ; RoHS: Yes; ComponentLink1Description: Datasheet; ComponentLink1URL: https://wmsc.lcsc.com/wmsc/upload/file/pdf/v2/lcsc/2304140030_FH--Guangdong-Fenghua-Advanced-Tech-CBG160808U221T_C92619.pdf; ComponentLink2Description: JLCPCB Part URL; ComponentLink2URL: https://jlcpcb.com/partdetail/C92619; ComponentLink3Description: LCSC Part URL; ComponentLink3URL: https://lcsc.com/product-detail/Ferrite-Beads_FH-Guangdong-Fenghua-Advanced-Tech-FH-Guangdong-Fenghua-Advanced-Tech-CBG160808U221T_C92619.html
footprint FB-0603 (0603 (1608M) Ferrite)
pins: 1, 2

## CBG160808U222T
designator FB?  Impedance @ Frequency: 2.2kΩ@100MHz
Ferrite, 2.2kΩ@100MHz, ±25%, 1.2Ω, 50mA, SMD 0603; Manufacturer: FH(Guangdong Fenghua Advanced Tech); Manufacturer Part Number: CBG160808U222T; Package Size: 0603; JLCPCB Basic Part: No; JLCPCB Part Number: C98505; Supplier 1: LCSC; Category: Ferrite Beads; Supplier Part Number 1: C98505; Tolerance: ±25%; Rated Current: 50mA; DC Resistance: 1.2Ω; RoHS: Yes; ComponentLink1Description: Datasheet; ComponentLink1URL: https://wmsc.lcsc.com/wmsc/upload/file/pdf/v2/lcsc/2304140030_FH--Guangdong-Fenghua-Advanced-Tech-CBG160808U222T_C98505.pdf; ComponentLink2Description: JLCPCB Part URL; ComponentLink2URL: https://jlcpcb.com/partdetail/C98505; ComponentLink3Description: LCSC Part URL; ComponentLink3URL: https://lcsc.com/product-detail/Ferrite-Beads_FH-Guangdong-Fenghua-Advanced-Tech-FH-Guangdong-Fenghua-Advanced-Tech-CBG160808U222T_C98505.html
footprint FB-0603 (0603 (1608M) Ferrite)
pins: 1, 2

## CBG160808U252T
designator FB?  Impedance @ Frequency: 2.5kΩ@100MHz
Ferrite, 2.5kΩ@100MHz, ±25%, 1.3Ω, 50mA, SMD 0603; Manufacturer: FH(Guangdong Fenghua Advanced Tech); Manufacturer Part Number: CBG160808U252T; Package Size: 0603; JLCPCB Basic Part: No; JLCPCB Part Number: C98506; Supplier 1: LCSC; Category: Ferrite Beads; Supplier Part Number 1: C98506; Tolerance: ±25%; Rated Current: 50mA; DC Resistance: 1.3Ω; RoHS: Yes; ComponentLink1Description: Datasheet; ComponentLink1URL: https://wmsc.lcsc.com/wmsc/upload/file/pdf/v2/lcsc/2304140030_FH--Guangdong-Fenghua-Advanced-Tech-CBG160808U252T_C98506.pdf; ComponentLink2Description: JLCPCB Part URL; ComponentLink2URL: https://jlcpcb.com/partdetail/C98506; ComponentLink3Description: LCSC Part URL; ComponentLink3URL: https://lcsc.com/product-detail/Ferrite-Beads_FH-Guangdong-Fenghua-Advanced-Tech-FH-Guangdong-Fenghua-Advanced-Tech-CBG160808U252T_C98506.html
footprint FB-0603 (0603 (1608M) Ferrite)
pins: 1, 2

## CBG160808U300T
designator FB?  Impedance @ Frequency: 30Ω@100MHz
Ferrite, 30Ω@100MHz, ±25%, SMD 0603; Manufacturer: FH(Guangdong Fenghua Advanced Tech); Manufacturer Part Number: CBG160808U300T; Package Size: 0603; JLCPCB Basic Part: No; JLCPCB Part Number: C98493; Supplier 1: LCSC; Category: Ferrite Beads; Supplier Part Number 1: C98493; Tolerance: ±25%; RoHS: Yes; ComponentLink1Description: Datasheet; ComponentLink1URL: https://wmsc.lcsc.com/wmsc/upload/file/pdf/v2/lcsc/2304140030_FH--Guangdong-Fenghua-Advanced-Tech-CBG160808U300T_C98493.pdf; ComponentLink2Description: JLCPCB Part URL; ComponentLink2URL: https://jlcpcb.com/partdetail/C98493; ComponentLink3Description: LCSC Part URL; ComponentLink3URL: https://lcsc.com/product-detail/Ferrite-Beads_FH-Guangdong-Fenghua-Advanced-Tech-FH-Guangdong-Fenghua-Advanced-Tech-CBG160808U300T_C98493.html
pins: 1, 2

## CBG160808U301T
designator FB?  Impedance @ Frequency: 300Ω@100MHz
Ferrite, 300Ω@100MHz, ±25%, 350mΩ, 200mA, SMD 0603; Manufacturer: FH(Guangdong Fenghua Advanced Tech); Manufacturer Part Number: CBG160808U301T; Package Size: 0603; JLCPCB Basic Part: No; JLCPCB Part Number: C98490; Supplier 1: LCSC; Category: Ferrite Beads; Supplier Part Number 1: C98490; Tolerance: ±25%; Rated Current: 200mA; DC Resistance: 350mΩ; RoHS: Yes; ComponentLink1Description: Datasheet; ComponentLink1URL: https://wmsc.lcsc.com/wmsc/upload/file/pdf/v2/lcsc/2304140030_FH--Guangdong-Fenghua-Advanced-Tech-CBG160808U301T_C98490.pdf; ComponentLink2Description: JLCPCB Part URL; ComponentLink2URL: https://jlcpcb.com/partdetail/C98490; ComponentLink3Description: LCSC Part URL; ComponentLink3URL: https://lcsc.com/product-detail/Ferrite-Beads_FH-Guangdong-Fenghua-Advanced-Tech-FH-Guangdong-Fenghua-Advanced-Tech-CBG160808U301T_C98490.html
footprint FB-0603 (0603 (1608M) Ferrite)
pins: 1, 2

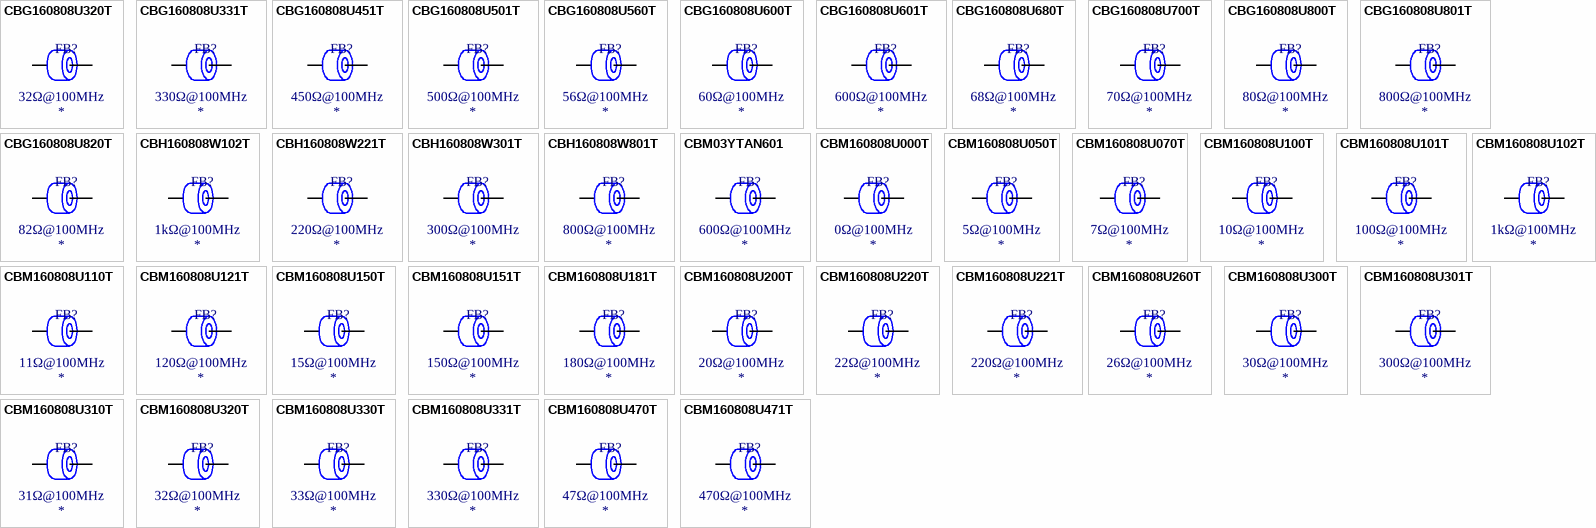
[diagram p6: symbols CBG160808U320T to CBM160808U471T]

## CBG160808U320T
designator FB?  Impedance @ Frequency: 32Ω@100MHz
Ferrite, 32Ω@100MHz, ±25%, SMD 0603; Manufacturer: FH(Guangdong Fenghua Advanced Tech); Manufacturer Part Number: CBG160808U320T; Package Size: 0603; JLCPCB Basic Part: No; JLCPCB Part Number: C880322; Supplier 1: LCSC; Category: Ferrite Beads; Supplier Part Number 1: C880322; Tolerance: ±25%; RoHS: Yes; ComponentLink1Description: Datasheet; ComponentLink1URL: https://wmsc.lcsc.com/wmsc/upload/file/pdf/v2/lcsc/2010141935_FH--Guangdong-Fenghua-Advanced-Tech-CBG160808U320T_C880322.pdf; ComponentLink2Description: JLCPCB Part URL; ComponentLink2URL: https://jlcpcb.com/partdetail/C880322; ComponentLink3Description: LCSC Part URL; ComponentLink3URL: https://lcsc.com/product-detail/Ferrite-Beads_FH-Guangdong-Fenghua-Advanced-Tech-FH-Guangdong-Fenghua-Advanced-Tech-CBG160808U320T_C880322.html
pins: 1, 2

## CBG160808U331T
designator FB?  Impedance @ Frequency: 330Ω@100MHz
Ferrite, 330Ω@100MHz, ±25%, SMD 0603; Manufacturer: FH(Guangdong Fenghua Advanced Tech); Manufacturer Part Number: CBG160808U331T; Package Size: 0603; JLCPCB Basic Part: No; JLCPCB Part Number: C124103; Supplier 1: LCSC; Category: Ferrite Beads; Supplier Part Number 1: C124103; Tolerance: ±25%; RoHS: Yes; ComponentLink1Description: Datasheet; ComponentLink1URL: https://wmsc.lcsc.com/wmsc/upload/file/pdf/v2/lcsc/2304140030_FH--Guangdong-Fenghua-Advanced-Tech-CBG160808U331T_C124103.pdf; ComponentLink2Description: JLCPCB Part URL; ComponentLink2URL: https://jlcpcb.com/partdetail/C124103; ComponentLink3Description: LCSC Part URL; ComponentLink3URL: https://lcsc.com/product-detail/Ferrite-Beads_FH-Guangdong-Fenghua-Advanced-Tech-FH-Guangdong-Fenghua-Advanced-Tech-CBG160808U331T_C124103.html
pins: 1, 2

## CBG160808U451T
designator FB?  Impedance @ Frequency: 450Ω@100MHz
Ferrite, 450Ω@100MHz, ±25%, SMD 0603; Manufacturer: FH(Guangdong Fenghua Advanced Tech); Manufacturer Part Number: CBG160808U451T; Package Size: 0603; JLCPCB Basic Part: No; JLCPCB Part Number: C668231; Supplier 1: LCSC; Category: Ferrite Beads; Supplier Part Number 1: C668231; Tolerance: ±25%; RoHS: Yes; ComponentLink1Description: Datasheet; ComponentLink1URL: https://wmsc.lcsc.com/wmsc/upload/file/pdf/v2/lcsc/2304140030_FH--Guangdong-Fenghua-Advanced-Tech-CBG160808U451T_C668231.pdf; ComponentLink2Description: JLCPCB Part URL; ComponentLink2URL: https://jlcpcb.com/partdetail/C668231; ComponentLink3Description: LCSC Part URL; ComponentLink3URL: https://lcsc.com/product-detail/Ferrite-Beads_FH-Guangdong-Fenghua-Advanced-Tech-FH-Guangdong-Fenghua-Advanced-Tech-CBG160808U451T_C668231.html
pins: 1, 2

## CBG160808U501T
designator FB?  Impedance @ Frequency: 500Ω@100MHz
Ferrite, 500Ω@100MHz, ±25%, 500mΩ, 200mA, SMD 0603; Manufacturer: FH(Guangdong Fenghua Advanced Tech); Manufacturer Part Number: CBG160808U501T; Package Size: 0603; JLCPCB Basic Part: No; JLCPCB Part Number: C87649; Supplier 1: LCSC; Category: Ferrite Beads; Supplier Part Number 1: C87649; Tolerance: ±25%; Rated Current: 200mA; DC Resistance: 500mΩ; RoHS: Yes; ComponentLink1Description: Datasheet; ComponentLink1URL: https://wmsc.lcsc.com/wmsc/upload/file/pdf/v2/lcsc/2304140030_FH--Guangdong-Fenghua-Advanced-Tech-CBG160808U501T_C87649.pdf; ComponentLink2Description: JLCPCB Part URL; ComponentLink2URL: https://jlcpcb.com/partdetail/C87649; ComponentLink3Description: LCSC Part URL; ComponentLink3URL: https://lcsc.com/product-detail/Ferrite-Beads_FH-Guangdong-Fenghua-Advanced-Tech-FH-Guangdong-Fenghua-Advanced-Tech-CBG160808U501T_C87649.html
footprint FB-0603 (0603 (1608M) Ferrite)
pins: 1, 2

## CBG160808U560T
designator FB?  Impedance @ Frequency: 56Ω@100MHz
Ferrite, 56Ω@100MHz, ±25%, SMD 0603; Manufacturer: FH(Guangdong Fenghua Advanced Tech); Manufacturer Part Number: CBG160808U560T; Package Size: 0603; JLCPCB Basic Part: No; JLCPCB Part Number: C1008; Supplier 1: LCSC; Category: Ferrite Beads; Supplier Part Number 1: C1008; Tolerance: ±25%; RoHS: Yes; ComponentLink1Description: Datasheet; ComponentLink1URL: https://wmsc.lcsc.com/wmsc/upload/file/pdf/v2/lcsc/2304140030_FH--Guangdong-Fenghua-Advanced-Tech-CBG160808U560T_C1008.pdf; ComponentLink2Description: JLCPCB Part URL; ComponentLink2URL: https://jlcpcb.com/partdetail/C1008; ComponentLink3Description: LCSC Part URL; ComponentLink3URL: https://lcsc.com/product-detail/Ferrite-Beads_FH-Guangdong-Fenghua-Advanced-Tech-FH-Guangdong-Fenghua-Advanced-Tech-CBG160808U560T_C1008.html
pins: 1, 2

## CBG160808U600T
designator FB?  Impedance @ Frequency: 60Ω@100MHz
Ferrite, 60Ω@100MHz, ±25%, 200mΩ, 300mA, SMD 0603; Manufacturer: FH(Guangdong Fenghua Advanced Tech); Manufacturer Part Number: CBG160808U600T; Package Size: 0603; JLCPCB Basic Part: No; JLCPCB Part Number: C1006; Supplier 1: LCSC; Category: Ferrite Beads; Supplier Part Number 1: C1006; Tolerance: ±25%; Rated Current: 300mA; DC Resistance: 200mΩ; RoHS: Yes; ComponentLink1Description: Datasheet; ComponentLink1URL: https://wmsc.lcsc.com/wmsc/upload/file/pdf/v2/lcsc/1811111512_FH--Guangdong-Fenghua-Advanced-Tech-CBG160808U600T_C1006.pdf; ComponentLink2Description: JLCPCB Part URL; ComponentLink2URL: https://jlcpcb.com/partdetail/C1006; ComponentLink3Description: LCSC Part URL; ComponentLink3URL: https://lcsc.com/product-detail/Ferrite-Beads_FH-Guangdong-Fenghua-Advanced-Tech-FH-Guangdong-Fenghua-Advanced-Tech-CBG160808U600T_C1006.html
footprint FB-0603 (0603 (1608M) Ferrite)
pins: 1, 2

## CBG160808U601T
designator FB?  Impedance @ Frequency: 600Ω@100MHz
Ferrite, 600Ω@100MHz, ±25%, 500mΩ, 200mA, SMD 0603; Manufacturer: FH(Guangdong Fenghua Advanced Tech); Manufacturer Part Number: CBG160808U601T; Package Size: 0603; JLCPCB Basic Part: No; JLCPCB Part Number: C73326; Supplier 1: LCSC; Category: Ferrite Beads; Supplier Part Number 1: C73326; Tolerance: ±25%; Rated Current: 200mA; DC Resistance: 500mΩ; RoHS: Yes; ComponentLink1Description: Datasheet; ComponentLink1URL: https://wmsc.lcsc.com/wmsc/upload/file/pdf/v2/lcsc/2304140030_FH--Guangdong-Fenghua-Advanced-Tech-CBG160808U601T_C73326.pdf; ComponentLink2Description: JLCPCB Part URL; ComponentLink2URL: https://jlcpcb.com/partdetail/C73326; ComponentLink3Description: LCSC Part URL; ComponentLink3URL: https://lcsc.com/product-detail/Ferrite-Beads_FH-Guangdong-Fenghua-Advanced-Tech-FH-Guangdong-Fenghua-Advanced-Tech-CBG160808U601T_C73326.html
footprint FB-0603 (0603 (1608M) Ferrite)
pins: 1, 2

## CBG160808U680T
designator FB?  Impedance @ Frequency: 68Ω@100MHz
Ferrite, 68Ω@100MHz, ±25%, SMD 0603; Manufacturer: FH(Guangdong Fenghua Advanced Tech); Manufacturer Part Number: CBG160808U680T; Package Size: 0603; JLCPCB Basic Part: No; JLCPCB Part Number: C1007; Supplier 1: LCSC; Category: Ferrite Beads; Supplier Part Number 1: C1007; Tolerance: ±25%; RoHS: Yes; ComponentLink1Description: Datasheet; ComponentLink1URL: https://wmsc.lcsc.com/wmsc/upload/file/pdf/v2/lcsc/1811061810_FH--Guangdong-Fenghua-Advanced-Tech-CBG160808U680T_C1007.pdf; ComponentLink2Description: JLCPCB Part URL; ComponentLink2URL: https://jlcpcb.com/partdetail/C1007; ComponentLink3Description: LCSC Part URL; ComponentLink3URL: https://lcsc.com/product-detail/Ferrite-Beads_FH-Guangdong-Fenghua-Advanced-Tech-FH-Guangdong-Fenghua-Advanced-Tech-CBG160808U680T_C1007.html
pins: 1, 2

## CBG160808U700T
designator FB?  Impedance @ Frequency: 70Ω@100MHz
Ferrite, 70Ω@100MHz, ±25%, 200mΩ, 300mA, SMD 0603; Manufacturer: FH(Guangdong Fenghua Advanced Tech); Manufacturer Part Number: CBG160808U700T; Package Size: 0603; JLCPCB Basic Part: No; JLCPCB Part Number: C98492; Supplier 1: LCSC; Category: Ferrite Beads; Supplier Part Number 1: C98492; Tolerance: ±25%; Rated Current: 300mA; DC Resistance: 200mΩ; RoHS: Yes; ComponentLink1Description: Datasheet; ComponentLink1URL: https://wmsc.lcsc.com/wmsc/upload/file/pdf/v2/lcsc/2304140030_FH--Guangdong-Fenghua-Advanced-Tech-CBG160808U700T_C98492.pdf; ComponentLink2Description: JLCPCB Part URL; ComponentLink2URL: https://jlcpcb.com/partdetail/C98492; ComponentLink3Description: LCSC Part URL; ComponentLink3URL: https://lcsc.com/product-detail/Ferrite-Beads_FH-Guangdong-Fenghua-Advanced-Tech-FH-Guangdong-Fenghua-Advanced-Tech-CBG160808U700T_C98492.html
footprint FB-0603 (0603 (1608M) Ferrite)
pins: 1, 2

## CBG160808U800T
designator FB?  Impedance @ Frequency: 80Ω@100MHz
Ferrite, 80Ω@100MHz, ±25%, 200mΩ, 300mA, SMD 0603; Manufacturer: FH(Guangdong Fenghua Advanced Tech); Manufacturer Part Number: CBG160808U800T; Package Size: 0603; JLCPCB Basic Part: No; JLCPCB Part Number: C98491; Supplier 1: LCSC; Category: Ferrite Beads; Supplier Part Number 1: C98491; Tolerance: ±25%; Rated Current: 300mA; DC Resistance: 200mΩ; RoHS: Yes; ComponentLink1Description: Datasheet; ComponentLink1URL: https://wmsc.lcsc.com/wmsc/upload/file/pdf/v2/lcsc/2304140030_FH--Guangdong-Fenghua-Advanced-Tech-CBG160808U800T_C98491.pdf; ComponentLink2Description: JLCPCB Part URL; ComponentLink2URL: https://jlcpcb.com/partdetail/C98491; ComponentLink3Description: LCSC Part URL; ComponentLink3URL: https://lcsc.com/product-detail/Ferrite-Beads_FH-Guangdong-Fenghua-Advanced-Tech-FH-Guangdong-Fenghua-Advanced-Tech-CBG160808U800T_C98491.html
footprint FB-0603 (0603 (1608M) Ferrite)
pins: 1, 2

## CBG160808U801T
designator FB?  Impedance @ Frequency: 800Ω@100MHz
Ferrite, 800Ω@100MHz, ±25%, 600mΩ, 200mA, SMD 0603; Manufacturer: FH(Guangdong Fenghua Advanced Tech); Manufacturer Part Number: CBG160808U801T; Package Size: 0603; JLCPCB Basic Part: No; JLCPCB Part Number: C98500; Supplier 1: LCSC; Category: Ferrite Beads; Supplier Part Number 1: C98500; Tolerance: ±25%; Rated Current: 200mA; DC Resistance: 600mΩ; RoHS: Yes; ComponentLink1Description: Datasheet; ComponentLink1URL: https://wmsc.lcsc.com/wmsc/upload/file/pdf/v2/lcsc/2304140030_FH--Guangdong-Fenghua-Advanced-Tech-CBG160808U801T_C98500.pdf; ComponentLink2Description: JLCPCB Part URL; ComponentLink2URL: https://jlcpcb.com/partdetail/C98500; ComponentLink3Description: LCSC Part URL; ComponentLink3URL: https://lcsc.com/product-detail/Ferrite-Beads_FH-Guangdong-Fenghua-Advanced-Tech-FH-Guangdong-Fenghua-Advanced-Tech-CBG160808U801T_C98500.html
footprint FB-0603 (0603 (1608M) Ferrite)
pins: 1, 2

## CBG160808U820T
designator FB?  Impedance @ Frequency: 82Ω@100MHz
Ferrite, 82Ω@100MHz, ±25%, SMD 0603; Manufacturer: FH(Guangdong Fenghua Advanced Tech); Manufacturer Part Number: CBG160808U820T; Package Size: 0603; JLCPCB Basic Part: No; JLCPCB Part Number: C1005; Supplier 1: LCSC; Category: Ferrite Beads; Supplier Part Number 1: C1005; Tolerance: ±25%; RoHS: Yes; ComponentLink1Description: Datasheet; ComponentLink2Description: JLCPCB Part URL; ComponentLink2URL: https://jlcpcb.com/partdetail/C1005; ComponentLink3Description: LCSC Part URL; ComponentLink3URL: https://lcsc.com/product-detail/Ferrite-Beads_FH-Guangdong-Fenghua-Advanced-Tech-FH-Guangdong-Fenghua-Advanced-Tech-CBG160808U820T_C1005.html
pins: 1, 2

## CBH160808W102T
designator FB?  Impedance @ Frequency: 1kΩ@100MHz
Ferrite, 1kΩ@100MHz, 650mΩ, 200mA, SMD 0603; Manufacturer: FH(Guangdong Fenghua Advanced Tech); Manufacturer Part Number: CBH160808W102T; Package Size: 0603; JLCPCB Basic Part: No; JLCPCB Part Number: C401490; Supplier 1: LCSC; Category: Ferrite Beads; Supplier Part Number 1: C401490; Rated Current: 200mA; DC Resistance: 650mΩ; RoHS: Yes; ComponentLink1Description: Datasheet; ComponentLink2Description: JLCPCB Part URL; ComponentLink2URL: https://jlcpcb.com/partdetail/C401490; ComponentLink3Description: LCSC Part URL; ComponentLink3URL: https://lcsc.com/product-detail/Ferrite-Beads_FH-Guangdong-Fenghua-Advanced-Tech-FH-Guangdong-Fenghua-Advanced-Tech-CBH160808W102T_C401490.html
pins: 1, 2

## CBH160808W221T
designator FB?  Impedance @ Frequency: 220Ω@100MHz
Ferrite, 220Ω@100MHz, ±25%, 300mΩ, 350mA, SMD 0603; Manufacturer: FH(Guangdong Fenghua Advanced Tech); Manufacturer Part Number: CBH160808W221T; Package Size: 0603; JLCPCB Basic Part: No; JLCPCB Part Number: C139160; Supplier 1: LCSC; Category: Ferrite Beads; Supplier Part Number 1: C139160; Tolerance: ±25%; Rated Current: 350mA; DC Resistance: 300mΩ; RoHS: Yes; ComponentLink1Description: Datasheet; ComponentLink1URL: https://wmsc.lcsc.com/wmsc/upload/file/pdf/v2/lcsc/2304140030_FH--Guangdong-Fenghua-Advanced-Tech-CBH160808W221T_C139160.pdf; ComponentLink2Description: JLCPCB Part URL; ComponentLink2URL: https://jlcpcb.com/partdetail/C139160; ComponentLink3Description: LCSC Part URL; ComponentLink3URL: https://lcsc.com/product-detail/Ferrite-Beads_FH-Guangdong-Fenghua-Advanced-Tech-FH-Guangdong-Fenghua-Advanced-Tech-CBH160808W221T_C139160.html
footprint FB-0603 (0603 (1608M) Ferrite)
pins: 1, 2

## CBH160808W301T
designator FB?  Impedance @ Frequency: 300Ω@100MHz
Ferrite, 300Ω@100MHz, ±25%, 400mΩ, 300mA, SMD 0603; Manufacturer: FH(Guangdong Fenghua Advanced Tech); Manufacturer Part Number: CBH160808W301T; Package Size: 0603; JLCPCB Basic Part: No; JLCPCB Part Number: C401489; Supplier 1: LCSC; Category: Ferrite Beads; Supplier Part Number 1: C401489; Tolerance: ±25%; Rated Current: 300mA; DC Resistance: 400mΩ; RoHS: Yes; ComponentLink1Description: Datasheet; ComponentLink1URL: https://wmsc.lcsc.com/wmsc/upload/file/pdf/v2/lcsc/1912111437_FH--Guangdong-Fenghua-Advanced-Tech-CBH160808W301T_C401489.pdf; ComponentLink2Description: JLCPCB Part URL; ComponentLink2URL: https://jlcpcb.com/partdetail/C401489; ComponentLink3Description: LCSC Part URL; ComponentLink3URL: https://lcsc.com/product-detail/Ferrite-Beads_FH-Guangdong-Fenghua-Advanced-Tech-FH-Guangdong-Fenghua-Advanced-Tech-CBH160808W301T_C401489.html
footprint FB-0603 (0603 (1608M) Ferrite)
pins: 1, 2
